# Altium footprint library LC_SensorNode.PcbLib: 30 footprints (part 1 of 2)
Each footprint in its own frame and in the unit in brackets; x right, y up, seen from the top. Pads: shape width x height; smd on the part's side, far side on the other; paste and mask are expansions set on the pad; w line width, h text height; cw(c..) or ccw(c..) is an arc to the next point about the centre after c.
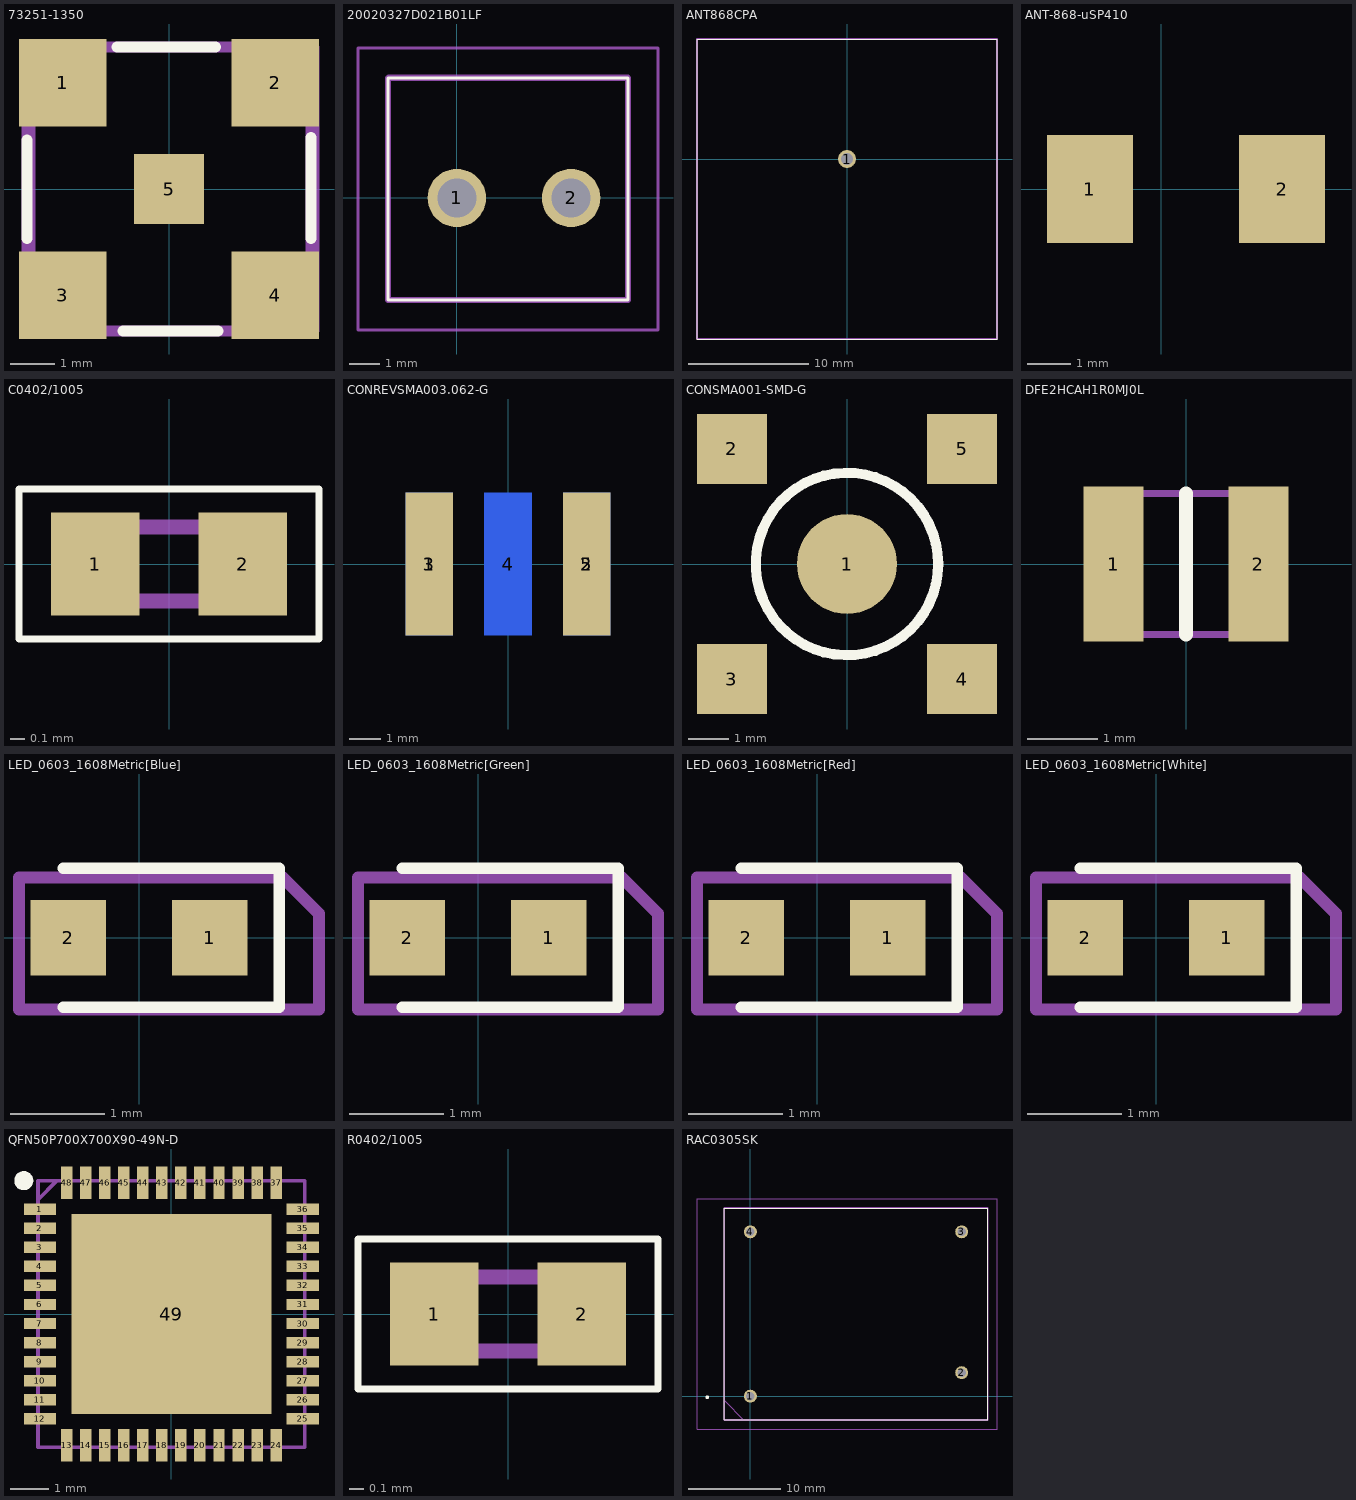
[diagram p0: the footprints below, top view; thin cyan lines are the x and y axes]

## 73251-1350 [mm]
pads (5):
  rect 1.96x1.96 smd: 1(-2.375,2.375) 2(2.375,2.375) 3(-2.375,-2.375) 4(2.375,-2.375)
  rect 1.57x1.57 smd: 5(0,0)
Top Overlay:
  lines w0.254: -3.175,-1.106 -3.175,1.087 ; -1.157,3.175 1.036,3.175 ; -1.024,-3.175 1.095,-3.175 ; 3.175,-1.106 3.175,1.146
Mechanical 13:
  lines w0.254: -3.175,-3.175 3.175,-3.175 3.175,3.175 -3.175,3.175 -3.175,-3.175
Top Designator (Mech29):
  lines w0.127: -3.048,-3.175 -3.048,3.175 3.302,3.175 3.302,-3.175 -3.048,-3.175
  text ".Designator" at -2.159,-0.381 h1
3D body "73251-1350.stp": height 9.53, standoff 0, extent -3.175,-3.175 3.175,3.175

## 20020327D021B01LF [mm]
pads (2):
  round 1.95 hole 1.3: 1(0,0) 2(3.81,0)
Top Overlay:
  lines w0.1: -2.3,-3.4 -2.3,4 5.71,4 5.71,-3.4 -2.3,-3.4
Mechanical 13:
  lines w0.2: -2.3,-3.4 -2.3,4 5.71,4 5.71,-3.4 -2.3,-3.4
Mechanical 15:
  lines w0.1: -3.3,-4.4 -3.3,5 6.71,5 6.71,-4.4 -3.3,-4.4
Top Designator (Mech29):
  lines w0.127: -2.286,-3.429 5.715,-3.429 5.715,4.064 -2.286,4.064 -2.286,-3.429
  text ".Designator" at -0.381,-0.127 h1
3D body "20020327-D021B01LF.stp": height 8.9, standoff -5, extent -2.3,-3.4 5.71,4

## ANT868CPA [mm]
pads (1):
  round 1.5 hole 1: 1(0,0)
Top Overlay:
  lines w0.1: -12.5,-15 -12.5,10 12.5,10 12.5,-15 -12.5,-15
Mechanical 13:
  lines w0.2: -12.5,-15 -12.5,10 12.5,10 12.5,-15 -12.5,-15
Top Designator (Mech29):
  text ".Designator" at -2.921,-3.429 h1
3D body "ANT-868-CPA.stp": height 4.1, standoff -5, extent -12.5,-15 12.5,10

## ANT-868-uSP410 [mm]
pads (2):
  rect 2x2.5 smd: 1(-1.651,0) 2(2.794,0)

## C0402/1005 [mm]
pads (2):
  rect 0.6x0.7 smd: 1(-0.5,0) 2(0.5,0)
Top Overlay:
  lines w0.05: -1.016,-0.508 -1.016,0.508 1.016,0.508 1.016,-0.508 -1.016,-0.508
Mechanical 13:
  lines w0.1: -0.5,-0.25 -0.5,0.25 0.5,0.25 0.5,-0.25 -0.5,-0.25
3D body "GCM155L81E104KE02D.stp": height 0.55, standoff 0, extent -0.5,-0.25 0.5,0.25

## CONREVSMA003.062-G [mm]
pads (5):
  rect 1.52x4.6 smd: 1(-2.54,0) 2(2.54,0)
  rect 1.52x4.6 smd far side: 3(-2.54,0) 4(0,0) 5(2.54,0)
3D body "User Library-RP_SMA_PCB.step": height 1.96, standoff -5.96, extent -4.633,-2.083 4.887,15.367

## CONSMA001-SMD-G [mm]
pads (5):
  round 2.5 smd: 1(0,0)
  rect 1.75x1.75 smd: 2(-2.875,2.875) 3(-2.875,-2.875) 4(2.875,-2.875) 5(2.875,2.875)
Top Overlay:
  circle w0.254: c0,0 r2.28
Top Designator (Mech29):
  text ".Designator" at -2.286,-0.508 h1

## DFE2HCAH1R0MJ0L [mm]
pads (2):
  rect 0.85x2.2 smd: 1(-1.025,0) 2(1.025,0)
Top Overlay:
  lines w0.2: 0,-1 0,1
Mechanical 13:
  lines w0.1: -1.25,-1 -1.25,1 1.25,1 1.25,-1 -1.25,-1
Top Designator (Mech29):
  text ".Designator" at -2.286,-0.508 h1
3D body "DFE252012P-4R7M=P2.stp": height 1.2, standoff 0, extent -1.25,-1 1.25,1

## LED_0603_1608Metric[Blue] [mm]
pads (2):
  rect 0.8x0.8 smd mask+0.051: 1(0.75,0) 2(-0.75,0)
Top Overlay:
  lines w0.12: -0.8,-0.735 1.485,-0.735 1.485,0.735 -0.8,0.735
Top Designator (Mech29):
  lines w0.127: -1.27,-0.762 -1.27,0.635 0.889,0.635 1.524,0.635 1.905,0.254 1.905,-0.762 -1.27,-0.762
  text ".Designator" at -1.016,-0.762 h1
  text "K" at 1.016,0.762 h1
3D body "User Library-LED_0603_B.STEP": height 0.6, standoff 0, extent -0.8,-0.4 0.8,0.4

## LED_0603_1608Metric[Green] [mm]
pads (2):
  rect 0.8x0.8 smd mask+0.051: 1(0.75,0) 2(-0.75,0)
Top Overlay:
  lines w0.12: -0.8,-0.735 1.485,-0.735 1.485,0.735 -0.8,0.735
Top Designator (Mech29):
  lines w0.127: -1.27,-0.762 1.905,-0.762 1.905,0.254 1.524,0.635 0.889,0.635 -1.27,0.635 -1.27,-0.762
  text "K" at 1.016,0.762 h1
  text ".Designator" at -1.016,-0.762 h1
3D body "User Library-LED_0603_G.STEP": height 0.6, standoff 0, extent -0.8,-0.4 0.8,0.4

## LED_0603_1608Metric[Red] [mm]
pads (2):
  rect 0.8x0.8 smd mask+0.051: 1(0.75,0) 2(-0.75,0)
Top Overlay:
  lines w0.12: -0.8,-0.735 1.485,-0.735 1.485,0.735 -0.8,0.735
Top Designator (Mech29):
  lines w0.127: -1.27,-0.762 -1.27,0.635 0.889,0.635 1.524,0.635 1.905,0.254 1.905,-0.762 -1.27,-0.762
  text ".Designator" at -1.016,-0.762 h1
  text "K" at 1.016,0.762 h1
3D body "red.step": height 0.6, standoff 0, extent -0.81,-0.4 0.81,0.4

## LED_0603_1608Metric[White] [mm]
pads (2):
  rect 0.8x0.8 smd mask+0.051: 1(0.75,0) 2(-0.75,0)
Top Overlay:
  lines w0.12: -0.8,-0.735 1.485,-0.735 1.485,0.735 -0.8,0.735
Top Designator (Mech29):
  lines w0.127: -1.27,-0.762 1.905,-0.762 1.905,0.254 1.524,0.635 0.889,0.635 -1.27,0.635 -1.27,-0.762
  text "K" at 1.016,0.762 h1
  text ".Designator" at -1.016,-0.762 h1
3D body "User Library-LED SMD0603.step": height 0.68, standoff 0, extent -0.825,-0.344 0.825,0.381

## PCBComponent_1 [mm]

## QFN50P700X700X90-49N-D [mm]
pads (49):
  rect 0.85x0.3 smd: 1(-3.45,2.75) 2(-3.45,2.25) 3(-3.45,1.75) 4(-3.45,1.25) 5(-3.45,0.75) 6(-3.45,0.25) 7(-3.45,-0.25) 8(-3.45,-0.75) 9(-3.45,-1.25) 10(-3.45,-1.75) 11(-3.45,-2.25) 12(-3.45,-2.75) 25(3.45,-2.75) 26(3.45,-2.25) 27(3.45,-1.75) 28(3.45,-1.25) 29(3.45,-0.75) 30(3.45,-0.25) 31(3.45,0.25) 32(3.45,0.75) 33(3.45,1.25) 34(3.45,1.75) 35(3.45,2.25) 36(3.45,2.75)
  rect 0.3x0.85 smd: 13(-2.75,-3.45) 14(-2.25,-3.45) 15(-1.75,-3.45) 16(-1.25,-3.45) 17(-0.75,-3.45) 18(-0.25,-3.45) 19(0.25,-3.45) 20(0.75,-3.45) 21(1.25,-3.45) 22(1.75,-3.45) 23(2.25,-3.45) 24(2.75,-3.45) 37(2.75,3.45) 38(2.25,3.45) 39(1.75,3.45) 40(1.25,3.45) 41(0.75,3.45) 42(0.25,3.45) 43(-0.25,3.45) 44(-0.75,3.45) 45(-1.25,3.45) 46(-1.75,3.45) 47(-2.25,3.45) 48(-2.75,3.45)
  rect 5.25x5.25 smd: 49(0,0)
Top Overlay:
  circle w0.25: c-3.875,3.5 r0.125
Mechanical 13:
  lines w0.1: -3.5,3 -3,3.5 ; -3.5,-3.5 -3.5,3.5 3.5,3.5 3.5,-3.5 -3.5,-3.5
Top Designator (Mech29):
  text ".Designator" at -2.413,-0.381 h1
3D body "ATSAMD51G19A-MU.stp": height 0.9, standoff 0, extent -3.55,-3.55 3.55,3.55

## R0402/1005 [mm]
pads (2):
  rect 0.6x0.7 smd: 1(-0.5,0) 2(0.5,0)
Top Overlay:
  lines w0.05: -1.016,-0.508 1.016,-0.508 1.016,0.508 -1.016,0.508 -1.016,-0.508
Mechanical 13:
  lines w0.1: -0.5,-0.25 0.5,-0.25 0.5,0.25 -0.5,0.25 -0.5,-0.25
Top Designator (Mech29):
  text ".Designator" at -2.286,-0.508 h1
3D body "CRCW040210K0FKEDC.stp": height 0.35, standoff 0, extent -0.5,-0.25 0.5,0.25

## RAC0305SK [mm]
pads (4):
  round 1.4 hole 0.9: 1(0,0) 2(22.86,2.54) 3(22.86,17.78) 4(0,17.78)
Top Overlay:
  lines w0.1: -2.82,-2.56 25.68,-2.56 25.68,20.34 -2.82,20.34 -2.82,-2.56
  lines w0.2: -4.77,-0.11 cw(c-4.67,-0.11) -4.57,-0.11 cw(c-4.67,-0.11) -4.77,-0.11
Mechanical 13:
  lines w0.2: -2.82,-2.56 25.68,-2.56 25.68,20.34 -2.82,20.34 -2.82,-2.56
Mechanical 15:
  lines w0.1: -5.77,-3.56 26.68,-3.56 26.68,21.34 -5.77,21.34 -5.77,-3.56
Top Designator (Mech29):
  lines w0.127: -2.794,-0.508 -2.794,19.177 -2.794,20.32 25.654,20.32 25.654,-2.54 4.953,-2.54 -0.762,-2.54 -2.794,-0.508
  text ".Designator" at 7.747,5.334 h1
3D body "RAC03-05SK.stp": height 18.14, standoff -4.76, extent -2.76,-2.88 25.74,20.62